# Altium integrated library vh_altium_library.intLib: 963 symbols (part 3 of 5) (continued)
## 74590A
designator U?
8-BIT BIN CNT WITH OUTPUT REGISTERS
footprint SO16W
pins: 1 QB (hiz), 2 QC (hiz), 3 QD (hiz), 4 QE (hiz), 5 QF (hiz), 6 QG (hiz), 7 QH (hiz), 8 GND (power) hidden to GND, 9 ~{RCO} (out), 10 ~{CCLR} (in), 11 CCK (in), 12 ~{CCKEN} (in), 13 RCK (in), 14 ~{G} (in), 15 QA (hiz), 16 VCC (power) hidden to VCC
1 alternate drawing of the same symbol

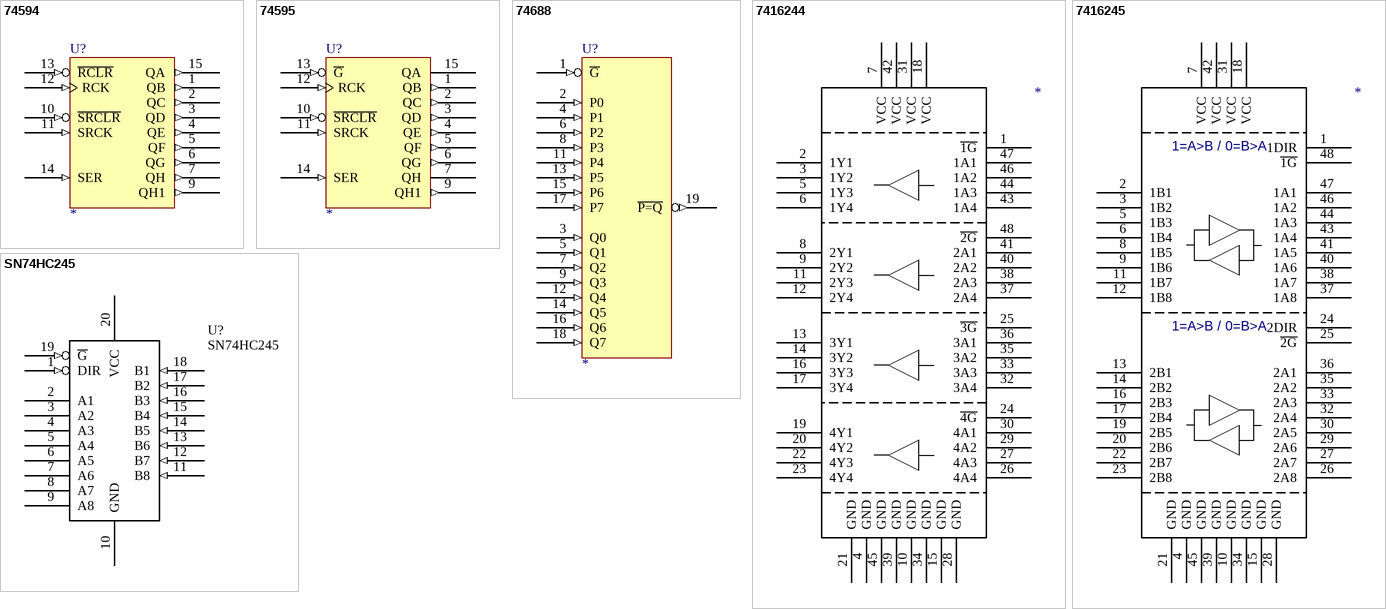
[diagram p34: symbols 74594 to SN74HC245]

## 74594
designator U?
8-BIT SFT REG WIRTH OUTPUT LCH
footprint SO16
pins: 1 QB (out), 2 QC (out), 3 QD (out), 4 QE (out), 5 QF (out), 6 QG (out), 7 QH (out), 8 GND (power) hidden to GND, 9 QH1 (out), 10 ~{SRCLR} (in), 11 SRCK (in), 12 RCK (in), 13 ~{RCLR} (in), 14 SER (in), 15 QA (out), 16 VCC (power) hidden to VCC
1 alternate drawing of the same symbol

## 74595
designator U?
8-BIT SFT REG WIRTH OUTPUT LCH
footprint SO16
pins: 1 QB (out), 2 QC (out), 3 QD (out), 4 QE (out), 5 QF (out), 6 QG (out), 7 QH (hiz), 8 GND (power) hidden to GND, 9 QH1 (out), 10 ~{SRCLR} (in), 11 SRCK (in), 12 RCK (in), 13 ~{G} (in), 14 SER (in), 15 QA (hiz), 16 VCC (power) hidden to VCC
1 alternate drawing of the same symbol

## 74688
designator U?
8-BIT IDENTITY COMPARATOR
footprint SO20W
pins: 1 ~{G} (in), 2 P0 (in), 3 Q0 (in), 4 P1 (in), 5 Q1 (in), 6 P2 (in), 7 Q2 (in), 8 P3 (in), 9 Q3 (in), 10 GND (power) hidden to GND, 11 P4 (in), 12 Q4 (in), 13 P5 (in), 14 Q5 (in), 15 P6 (in), 16 Q6 (in), 17 P7 (in), 18 Q7 (in), 19 ~{P=Q} (out), 20 VCC (power) hidden to VCC
1 alternate drawing of the same symbol

## 7416244
designator ?
pins: 1 ~{1G}, 2 1Y1, 3 1Y2, 4 GND, 5 1Y3, 6 1Y4, 7 VCC, 8 2Y1, 9 2Y2, 10 GND, 11 2Y3, 12 2Y4, 13 3Y1, 14 3Y2, 15 GND, 16 3Y3, 17 3Y4, 18 VCC, 19 4Y1, 20 4Y2, 21 GND, 22 4Y3, 23 4Y4, 24 ~{4G}, 25 ~{3G}, 26 4A4, 27 4A3, 28 GND, 29 4A2, 30 4A1, 31 VCC, 32 3A4, 33 3A3, 34 GND, 35 3A2, 36 3A1, 37 2A4, 38 2A3, 39 GND, 40 2A2, 41 2A1, 42 VCC, 43 1A4, 44 1A3, 45 GND, 46 1A2, 47 1A1, 48 ~{2G}

## 7416245
designator ?
pins: 1 1DIR, 2 1B1, 3 1B2, 4 GND, 5 1B3, 6 1B4, 7 VCC, 8 1B5, 9 1B6, 10 GND, 11 1B7, 12 1B8, 13 2B1, 14 2B2, 15 GND, 16 2B3, 17 2B4, 18 VCC, 19 2B5, 20 2B6, 21 GND, 22 2B7, 23 2B8, 24 2DIR, 25 ~{2G}, 26 2A8, 27 2A7, 28 GND, 29 2A6, 30 2A5, 31 VCC, 32 2A4, 33 2A3, 34 GND, 35 2A2, 36 2A1, 37 1A8, 38 1A7, 39 GND, 40 1A6, 41 1A5, 42 VCC, 43 1A4, 44 1A3, 45 GND, 46 1A2, 47 1A1, 48 ~{1G}
text: 1=A>B / 0=B>A

## SN74HC245
designator U?
QUAD BUS TRANSCEIVER 3SO
footprint SO20W
footprint SO20
pins: 1 DIR (in), 2 A1 (hiz), 3 A2 (hiz), 4 A3 (hiz), 5 A4 (hiz), 6 A5 (hiz), 7 A6 (hiz), 8 A7 (hiz), 9 A8 (hiz), 10 GND (power), 11 B8 (in), 12 B7 (in), 13 B6 (in), 14 B5 (in), 15 B4 (in), 16 B3 (in), 17 B2 (in), 18 B1 (in), 19 ~{G} (in), 20 VCC (power)
1 alternate drawing of the same symbol


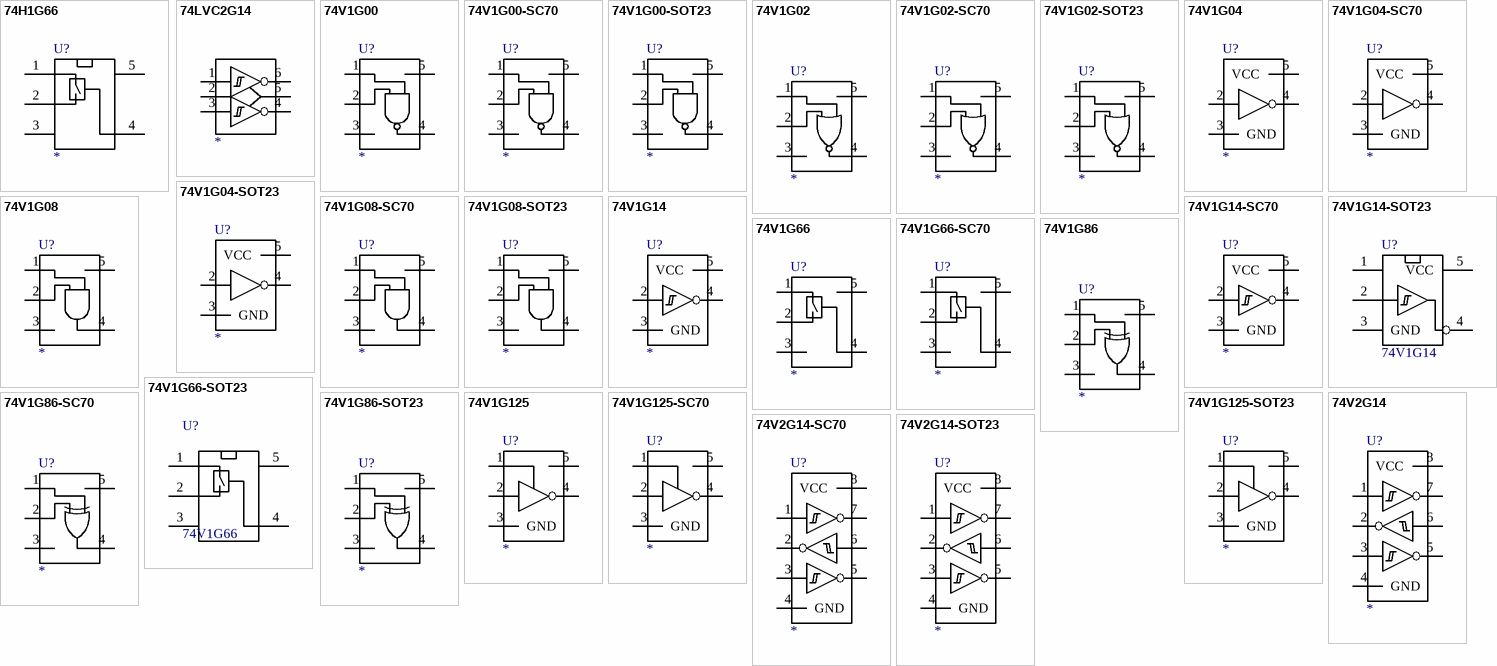
[diagram p35: symbols 74H1G66 to 74V2G14-SOT23]

## 74H1G66
designator U?
SINGLEGATE CMOS SWITCH SPST; Supplier 1: Digi-Key; Supplier Part Number 1: 497-1245-2-ND
footprint SOT23-5
pins: 1, 2, 3, 4, 5

## 74LVC2G14
designator ?
footprint SOT23-6
pins: 1, 2, 3, 4, 5, 6

## 74V1G00
designator U?
SINGLE GATE INVERTER
footprint SOT23-5
pins: 1, 2, 3, 4, 5

## 74V1G00-SC70
designator U?
SINGLE GATE INVERTER
footprint SOT23-5
pins: 1, 2, 3, 4, 5

## 74V1G00-SOT23
designator U?
SINGLE GATE INVERTER
footprint SOT23-5
pins: 1, 2, 3, 4, 5

## 74V1G02
designator U?
SINGLE GATE INVERTER
footprint SOT23-5
pins: 1, 2, 3, 4, 5

## 74V1G02-SC70
designator U?
SINGLE GATE INVERTER
footprint SOT23-5
pins: 1, 2, 3, 4, 5

## 74V1G02-SOT23
designator U?
SINGLE GATE INVERTER
footprint SOT23-5
pins: 1, 2, 3, 4, 5

## 74V1G04
designator U?
SINGLE GATE INVERTER
footprint SOT23-5
pins: 2, 3 GND, 4, 5 VCC

## 74V1G04-SC70
designator U?
SINGLE GATE INVERTER
footprint SOT23-5
pins: 2, 3 GND, 4, 5 VCC

## 74V1G04-SOT23
designator U?
SINGLE GATE INVERTER
footprint SOT23-5
pins: 2, 3 GND, 4, 5 VCC

## 74V1G08
designator U?
SINGLE GATE INVERTER
footprint SOT23-5
pins: 1, 2, 3, 4, 5

## 74V1G08-SC70
designator U?
SINGLE GATE INVERTER
footprint SOT23-5
pins: 1, 2, 3, 4, 5

## 74V1G08-SOT23
designator U?
SINGLE GATE INVERTER
footprint SOT23-5
pins: 1, 2, 3, 4, 5

## 74V1G14
designator U?
SINGLE GATE SCHMITTTRIGGER
footprint SOT23-5
pins: 2, 3 GND, 4, 5 VCC

## 74V1G14-SC70
designator U?
SINGLE GATE SCHMITTTRIGGER
footprint SOT23-5
pins: 2, 3 GND, 4, 5 VCC

## 74V1G14-SOT23
designator U?, comment 74V1G14
SINGLE GATE SCHMITTTRIGGER; Supplier 1: Digi-Key; Supplier Part Number 1: 497-1270-2-ND
footprint SOT23-5
pins: 1, 2, 3 GND, 4, 5 VCC

## 74V1G66
designator U?
SINGLE GATE INVERTER
footprint SOT23-5
pins: 1, 2, 3, 4, 5

## 74V1G66-SC70
designator U?
SINGLE GATE INVERTER
footprint SOT23-5
pins: 1, 2, 3, 4, 5

## 74V1G66-SOT23
designator U?, comment 74V1G66
SINGLE GATE INVERTER; Supplier 1: Digi-Key; Supplier Part Number 1: 497-1273-1-ND
footprint SOT23-5
pins: 1, 2, 3, 4, 5

## 74V1G86
designator U?
SINGLE GATE INVERTER
footprint SOT23-5
pins: 1, 2, 3, 4, 5

## 74V1G86-SC70
designator U?
SINGLE GATE INVERTER
footprint SOT23-5
pins: 1, 2, 3, 4, 5

## 74V1G86-SOT23
designator U?
SINGLE GATE INVERTER
footprint SOT23-5
pins: 1, 2, 3, 4, 5

## 74V1G125
designator U?
SINGLE GATE SCHMITTTRIGGER
footprint SOT23-5
pins: 1 ~{G}, 2, 3 GND, 4, 5 +

## 74V1G125-SC70
designator U?
SINGLE GATE SCHMITTTRIGGER
footprint SOT23-5
pins: 1 ~{G}, 2, 3 GND, 4, 5 +

## 74V1G125-SOT23
designator U?
SINGLE GATE SCHMITTTRIGGER
footprint SOT23-5
pins: 1 ~{G}, 2, 3 GND, 4, 5 +

## 74V2G14
designator U?
TRIPLE GATE SCHMITTTRIGGER
footprint SOT23-8
pins: 1, 2, 3, 4 GND, 5, 6, 7, 8 VCC

## 74V2G14-SC70
designator U?
TRIPLE GATE SCHMITTTRIGGER
footprint SOT23-8
pins: 1, 2, 3, 4 GND, 5, 6, 7, 8 VCC

## 74V2G14-SOT23
designator U?
TRIPLE GATE SCHMITTTRIGGER
footprint SOT23-8
pins: 1, 2, 3, 4 GND, 5, 6, 7, 8 VCC


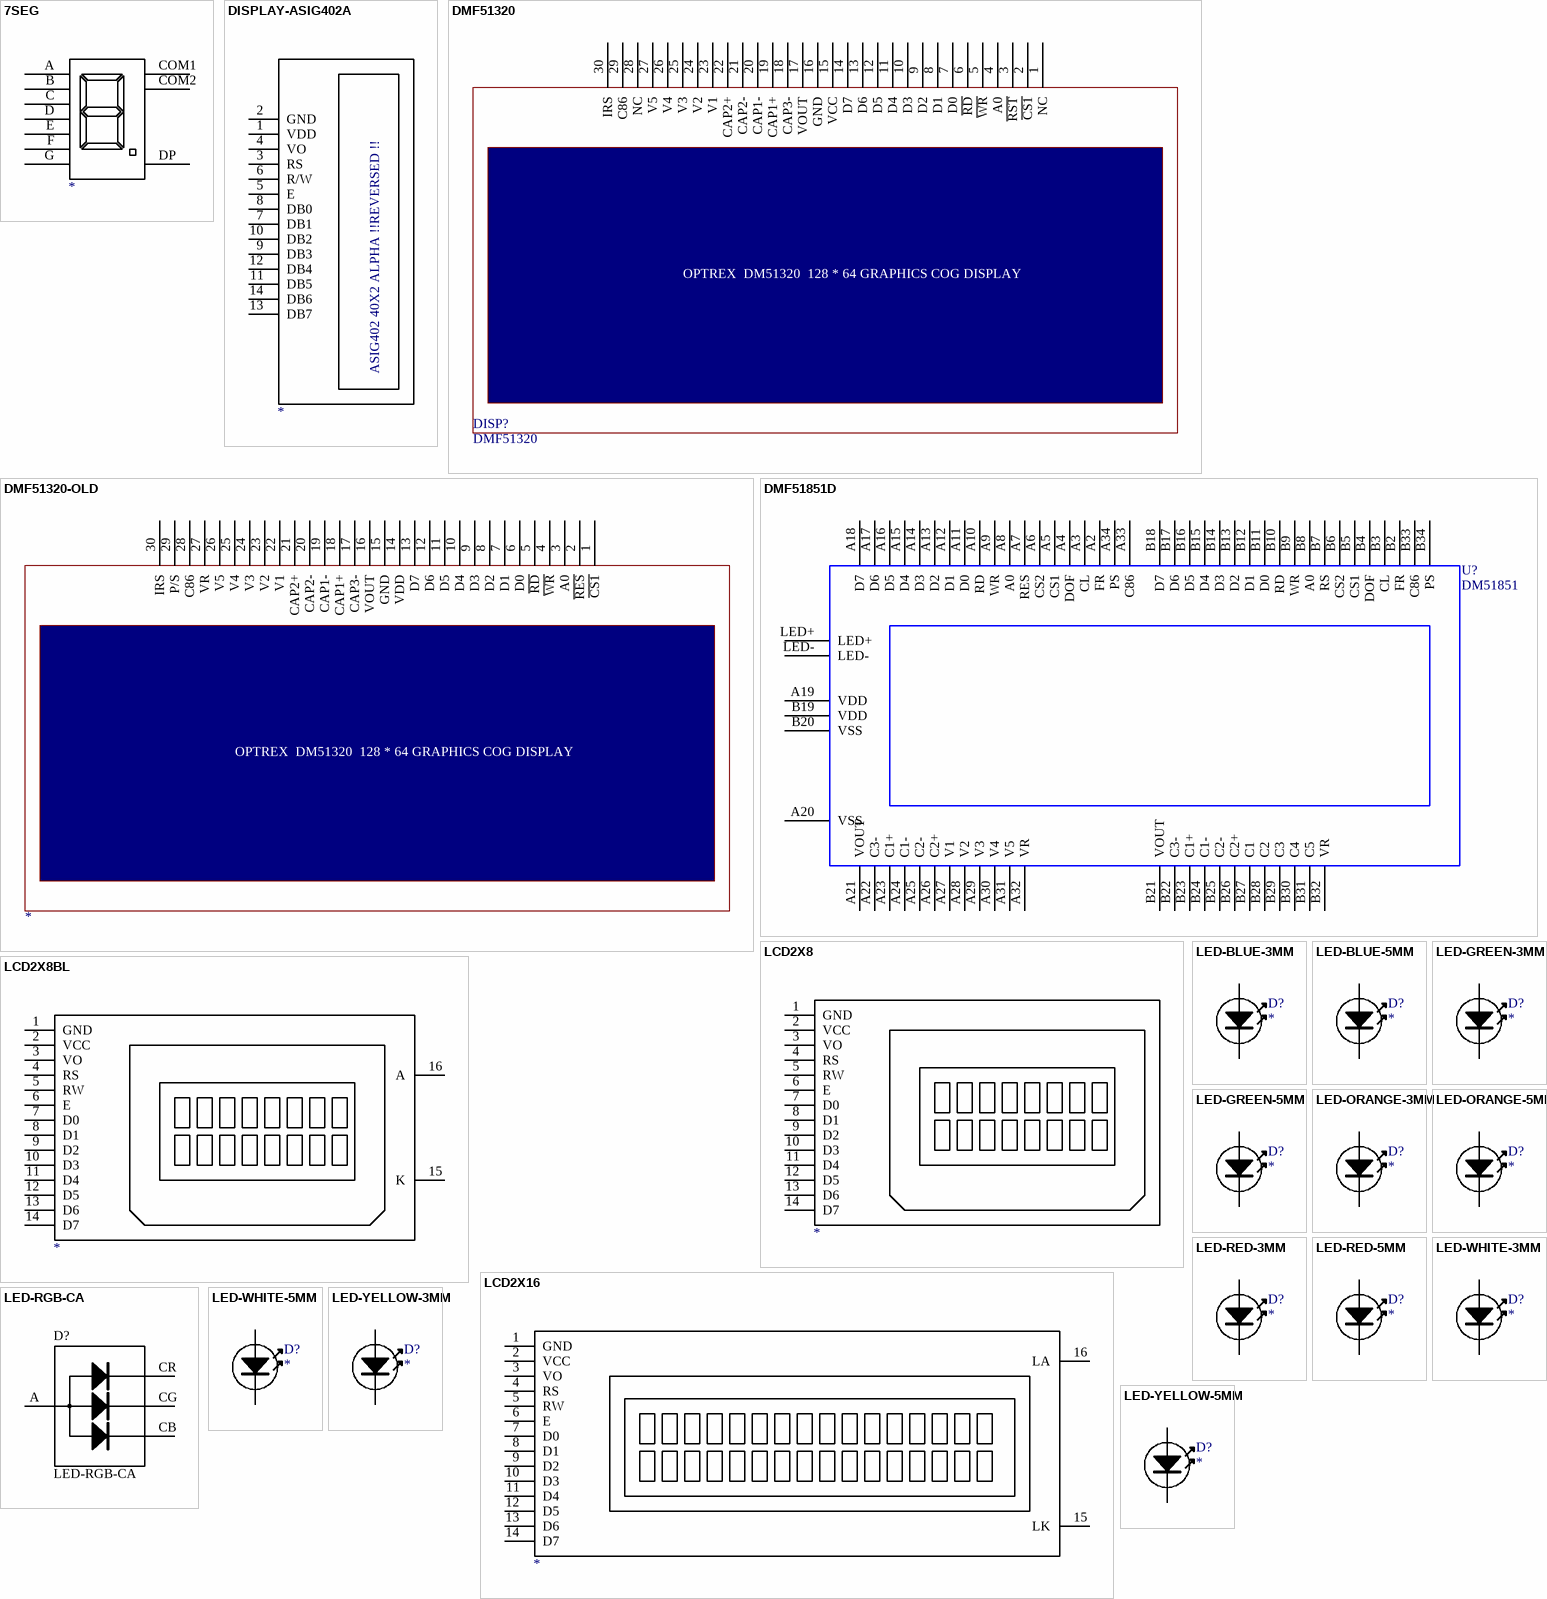
[diagram p36: symbols 7SEG to LED-YELLOW-5MM]

## 7SEG
designator ?
pins: A, B, C, COM1, COM2, D, DP, E, F, G

## DISPLAY-ASIG402A
designator ?
pins: 1 VDD, 2 GND, 3 RS, 4 VO, 5 E, 6 R/W, 7 DB1, 8 DB0, 9 DB3, 10 DB2, 11 DB5, 12 DB4, 13 DB7, 14 DB6
text: ASIG402 40X2 ALPHA !!REVERSED !!

## DMF51320
designator DISP?
pins: 1 NC, 2 ~{CS1}, 3 ~{RST}, 4 A0, 5 ~{WR}, 6 ~{RD}, 7 D0, 8 D1, 9 D2, 10 D3, 11 D4, 12 D5, 13 D6, 14 D7, 15 VCC, 16 GND, 17 VOUT, 18 CAP3-, 19 CAP1+, 20 CAP1-, 21 CAP2-, 22 CAP2+, 23 V1, 24 V2, 25 V3, 26 V4, 27 V5, 28 NC, 29 C86, 30 IRS
text: OPTREX  DM51320  128 * 64 GRAPHICS COG DISPLAY

## DMF51320-OLD
designator ?
pins: 1 ~{CS1}, 2 ~{RES}, 3 A0, 4 ~{WR}, 5 ~{RD}, 6 D0, 7 D1, 8 D2, 9 D3, 10 D4, 11 D5, 12 D6, 13 D7, 14 VDD, 15 GND, 16 VOUT, 17 CAP3-, 18 CAP1+, 19 CAP1-, 20 CAP2-, 21 CAP2+, 22 V1, 23 V2, 24 V3, 25 V4, 26 V5, 27 VR, 28 C86, 29 P/S, 30 IRS
text: OPTREX  DM51320  128 * 64 GRAPHICS COG DISPLAY

## DMF51851D
designator U?, comment DM51851
DM51851 DISPLAY 240X64
footprint F51851
pins: A2 FR, A3 CL, A4 DOF, A5 CS1, A6 CS2, A7 RES, A8 A0, A9 WR, A10 RD, A11 D0, A12 D1, A13 D2, A14 D3, A15 D4, A16 D5, A17 D6, A18 D7, A19 VDD, A20 VSS, A21 VOUT, A22 C3-, A23 C1+, A24 C1-, A25 C2-, A26 C2+, A27 V1, A28 V2, A29 V3, A30 V4, A31 V5, A32 VR, A33 C86, A34 PS, B2 FR, B3 CL, B4 DOF, B5 CS1, B6 CS2, B7 RS, B8 A0, B9 WR, B10 RD, B11 D0, B12 D1, B13 D2, B14 D3, B15 D4, B16 D5, B17 D6, B18 D7, B19 VDD, B20 VSS, B21 VOUT, B22 C3-, B23 C1+, B24 C1-, B25 C2-, B26 C2+, B27 C1, B28 C2, B29 C3, B30 C4, B31 C5, B32 VR, B33 C86, B34 PS, LED+, LED-

## LCD2X8
designator ?
footprint LCD2x8
pins: 1 GND, 2 VCC, 3 VO, 4 RS, 5 RW, 6 E, 7 D0, 8 D1, 9 D2, 10 D3, 11 D4, 12 D5, 13 D6, 14 D7

## LCD2X8BL
designator ?
footprint LCD2x8BL
pins: 1 GND, 2 VCC, 3 VO, 4 RS, 5 RW, 6 E, 7 D0, 8 D1, 9 D2, 10 D3, 11 D4, 12 D5, 13 D6, 14 D7, 15 K, 16 A

## LCD2X16
designator ?
pins: 1 GND, 2 VCC, 3 VO, 4 RS, 5 RW, 6 E, 7 D0, 8 D1, 9 D2, 10 D3, 11 D4, 12 D5, 13 D6, 14 D7, 15 LK, 16 LA

## LED-BLUE-3MM
designator D?
LED-BLUE-3MM
footprint LED-3MM-BLUE
pins: A, K

## LED-BLUE-5MM
designator D?
LED-BLUE-5MM
footprint LED-5MM-BLUE
pins: A, K

## LED-GREEN-3MM
designator D?
LED-GREEN-3MM
footprint LED-3MM-GREEN
pins: A, K

## LED-GREEN-5MM
designator D?
LED-GREEN-5MM
footprint LED-5MM-GREEN
pins: A, K

## LED-ORANGE-3MM
designator D?
LED-ORANGE-3MM
footprint LED-3MM-ORANGE
pins: A, K

## LED-ORANGE-5MM
designator D?
LED-ORANGE-5MM
footprint LED-5MM-ORANGE
pins: A, K

## LED-RED-3MM
designator D?
LED-RED-3MM
footprint LED-3MM-RED
pins: A, K

## LED-RED-5MM
designator D?
LED-RED-5MM
footprint LED-5MM-RED
pins: A, K

## LED-RGB-CA
designator D?
footprint LED-5MMRGBCA
pins: A, CB, CG, CR

## LED-WHITE-3MM
designator D?
LED-WHITE-3MM
footprint LED-3MM-WHITE
pins: A, K

## LED-WHITE-5MM
designator D?
LED-WHITE-5MM
footprint LED-5MM-WHITE
pins: A, K

## LED-YELLOW-3MM
designator D?
LED-YELLOW-3MM
footprint LED-3MM-YELLOW
pins: A, K

## LED-YELLOW-5MM
designator D?
LED-YELLOW-5MM
footprint LED-5MM-YELLOW
pins: A, K

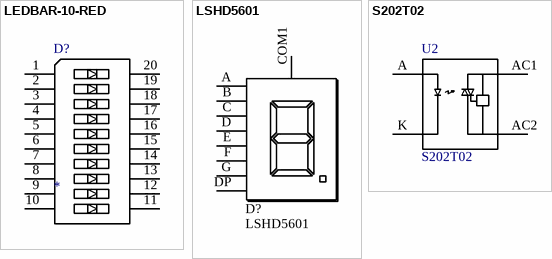
[diagram p37: symbols LEDBAR-10-RED to S202T02]

## LEDBAR-10-RED
designator D?
Supplier 1: Mouser; Supplier Part Number 1: 604-DC10GWA
footprint LEDBAR-10-RED
pins: 1, 2, 3, 4, 5, 6, 7, 8, 9, 10, 11, 12, 13, 14, 15, 16, 17, 18, 19, 20

## LSHD5601
designator D?
Supplier 1: Mouser; Supplier Part Number 1: 859-LSHD-5601
footprint LSHD5601
pins: A, B, C, COM1, D, DP, E, F, G

## S202T02
designator U2
Supplier 1: Digi-Key; Supplier 2: Digi-Key; Supplier Part Number 2: 425-2409-5-ND
footprint S202T02
pins: A, AC1, AC2, K


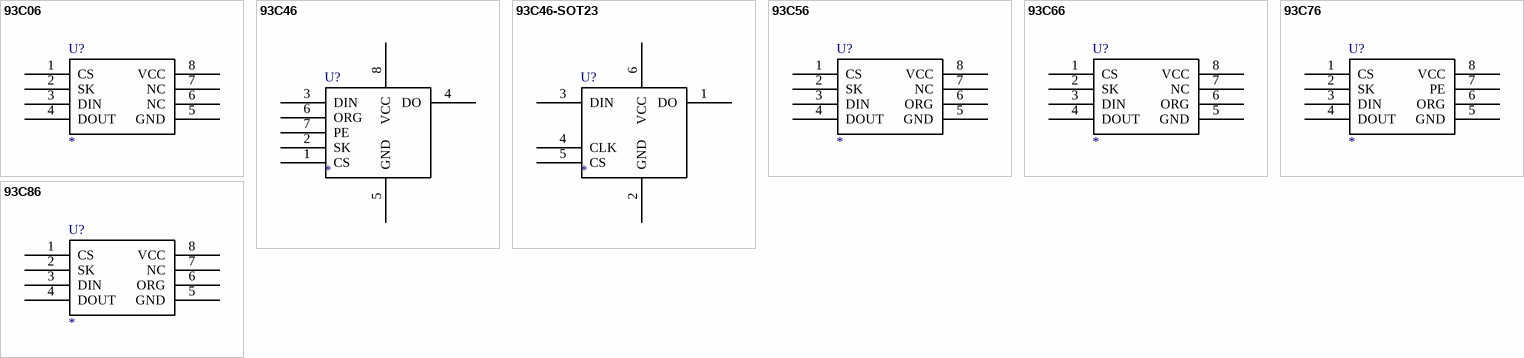
[diagram p38: symbols 93C06 to 93C86]

## 93C06
designator U?
MICROWIRE EEPROM
footprint SO8
pins: 1 CS, 2 SK, 3 DIN, 4 DOUT, 5 GND, 6 NC, 7 NC, 8 VCC

## 93C46
designator U?
MICROWIRE EEPROM
footprint SO8
pins: 1 CS, 2 SK, 3 DIN, 4 DO, 5 GND, 6 ORG, 7 PE, 8 VCC

## 93C46-SOT23
designator U?
MICROWIRE EEPROM
footprint SOT23-6
pins: 1 DO, 2 GND, 3 DIN, 4 CLK, 5 CS, 6 VCC

## 93C56
designator U?
MICROWIRE EEPROM
footprint SO8
pins: 1 CS, 2 SK, 3 DIN, 4 DOUT, 5 GND, 6 ORG, 7 NC, 8 VCC

## 93C66
designator U?
MICROWIRE EEPROM
footprint SO8
pins: 1 CS, 2 SK, 3 DIN, 4 DOUT, 5 GND, 6 ORG, 7 NC, 8 VCC

## 93C76
designator U?
MICROWIRE EEPROM
footprint SO8
pins: 1 CS, 2 SK, 3 DIN, 4 DOUT, 5 GND, 6 ORG, 7 PE, 8 VCC

## 93C86
designator U?
MICROWIRE EEPROM
footprint SO8
pins: 1 CS, 2 SK, 3 DIN, 4 DOUT, 5 GND, 6 ORG, 7 NC, 8 VCC


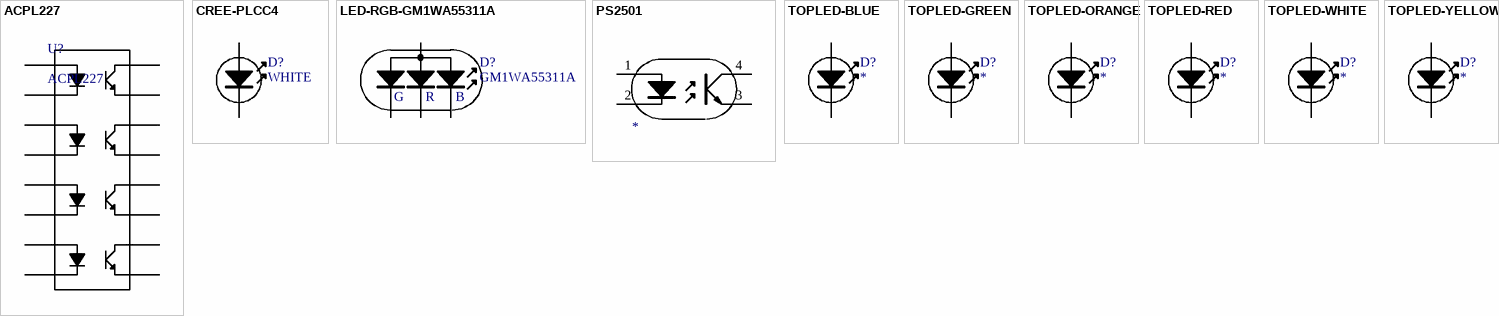
[diagram p39: symbols ACPL227 to TOPLED-YELLOW]

## ACPL227
designator U?
QUAD OPTOCOUPLER; Supplier 1: Mouser; Supplier Part Number 1: 630-ACPL-227-50BE
footprint SO16
pins: 1 A1, 2 K1, 3 A2, 4 K2, 5 A3, 6 K3, 7 A4, 8 K4, 9 E4, 10 C4, 11 E3, 12 C3, 13 E2, 14 C2, 15 E1, 16 C1

## CREE-PLCC4
designator D?, comment WHITE
CREE WHITE LED; Supplier 1: Digi-Key; Supplier Part Number 1: CLA1B-WKW-XD0F0E13TR-ND
footprint CREE-PLCC4
pins: A, K

## LED-RGB-GM1WA55311A
designator D?, comment GM1WA55311A
LED RGB SMD
pins: 1, 2, 3, 4 C
text: G; R; B

## PS2501
designator ?
pins: 1, 2, 3, 4

## TOPLED-BLUE
designator D?
TOPLED-BLUE; Manufacturer: Kingbright Corp; Manufacturer Part Number: AA3528APBC/A; Description: LED 3.5X2.8MM 470NM BLUE CLR SMD; Supplier 1: Digi-Key; Supplier Part Number 1: 754-1011-2-ND
footprint TOPLED-BLUE
pins: A, K

## TOPLED-GREEN
designator D?
TOPLED-GREEN
footprint TOPLED-GREEN
pins: A, K

## TOPLED-ORANGE
designator D?
TOPLED-ORANGE; Reel: D13; Supplier 1: Digi-Key; Supplier Part Number 1: 475-2562-2-ND
footprint TOPLED-ORANGE
pins: A, K

## TOPLED-RED
designator D?
TOPLED-RED; Manufacturer: OSRAM Opto Semiconductors Inc; Manufacturer Part Number: LS T676-Q1R2-1-Z; Description: LED SUP RED 645NM CLR 2-PLCC SMD; Reel: D13; Supplier 1: Digi-Key; Supplier Part Number 1: 475-1133-2-ND
footprint TOPLED-RED
pins: A, K

## TOPLED-WHITE
designator D?
TOPLED-WHITE
footprint TOPLED-WHITE
pins: A, K

## TOPLED-YELLOW
designator D?
TOPLED-YELLOW; Manufacturer Part Number: LY T676-S1T1-26-Z; Manufacturer: OSRAM Opto Semiconductors Inc; Description: LED TOPLED 587NM YELLOW 2-PLCC; Supplier 1: Digi-Key; Supplier Part Number 1: 475-2665-2-ND
footprint TOPLED-YELLOW
pins: A, K


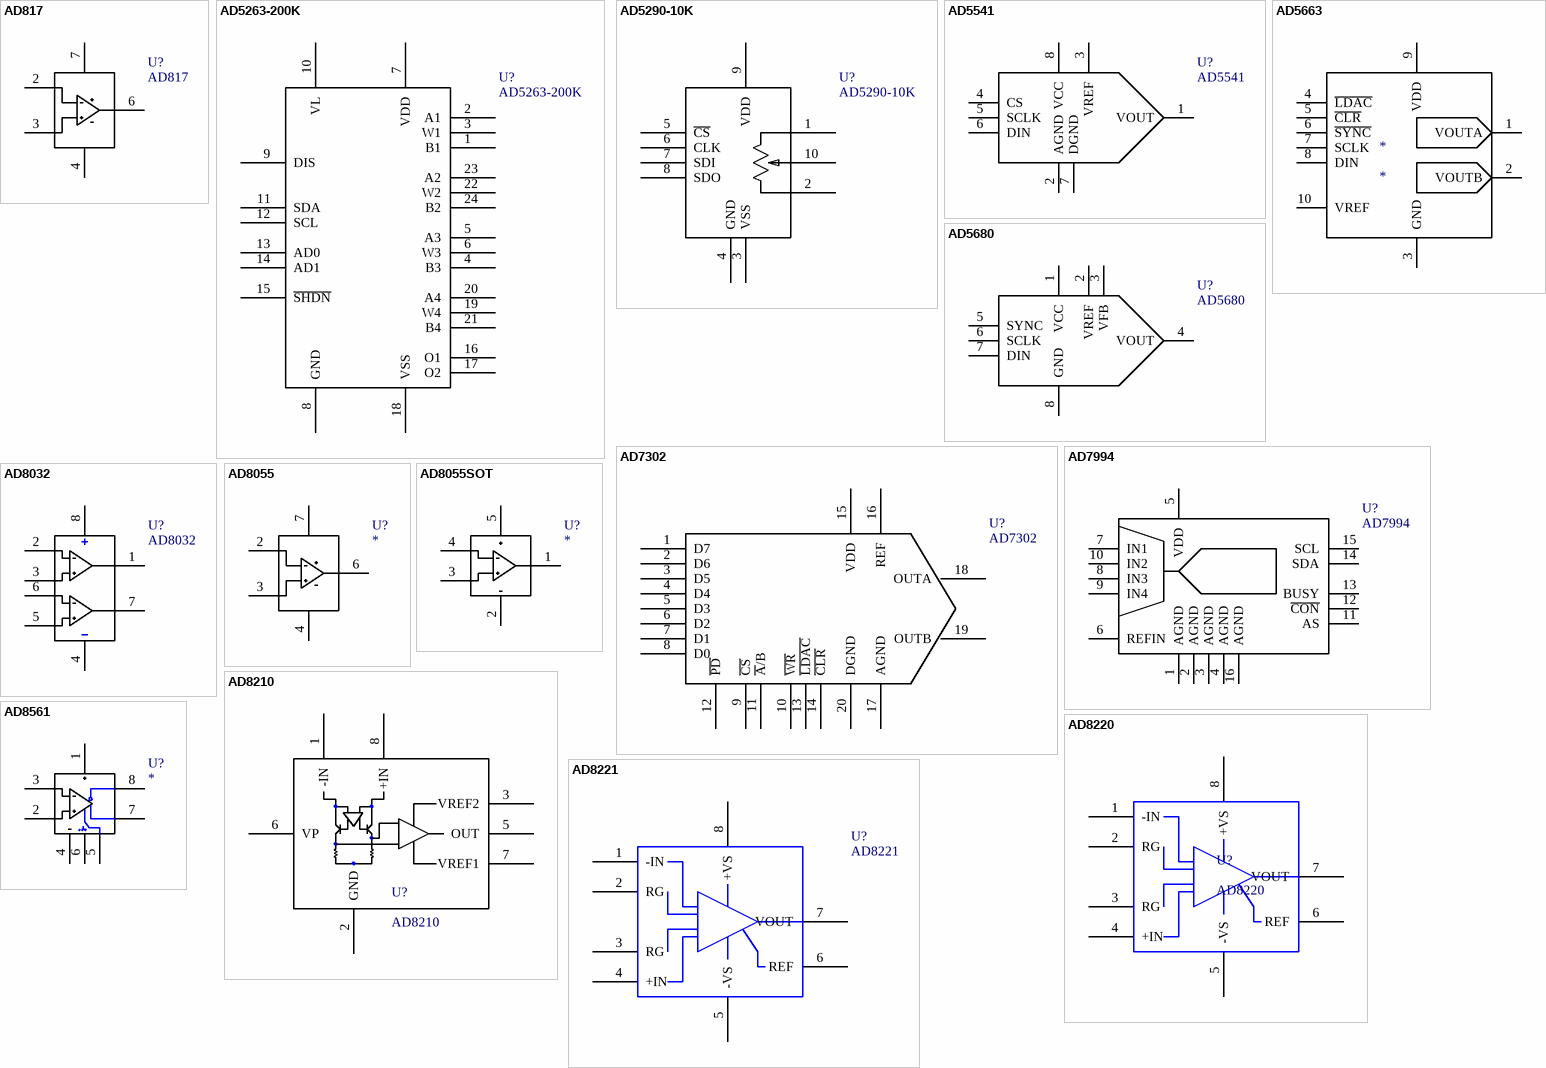
[diagram p40: symbols AD817 to AD8561]

## AD817
designator U?
OPAMP; Manufacturer Part Number: AD817ARZ; Manufacturer: Analog Devices Inc; Description: IC OPAMP LP HS 8-SOIC; Slew Rate: 350 V/µs; Current - Supply: 7mA; Number of Circuits: 1; Voltage - Supply, Single/Dual (±): 5 V ~ 36 V, ±2.5 V ~ 18 V; -3db Bandwidth: 50MHz; Current - Output / Channel: 50mA; Supplier 1: Digi-Key; Supplier Part Number 1: AD817ARZ-ND; Supplier Part Number: AD817ARZ-ND; Applications: General Purpose; Packaging: Tube; Package / Case: 8-SOIC (3.9mm Width); Supplier Device Package: *; Output Type: -; RoHS: RoHS Compliant; Category: Integrated Circuits (ICs); Mounting Type: Surface Mount; Supplier: Digi-Key
footprint SO8
pins: 2, 3, 4, 6, 7

## AD5263-200K
designator U?
QUAD DIGITAL POTMETER; Manufacturer Part Number: AD5263BRU200; Manufacturer: Analog Devices Inc; Voltage - Supply: 2.7 V ~ 16.5 V, ±4.5 V ~ 7.5 V; Temperature Coefficient: 30 ppm/°C Typical; Taps: 256; Resistance In Ohms: 200K; Number of Circuits: 4; Memory Type: Volatile; Description: IC POT QUAD 200K 256POS 24-TSSOP; Interface: I²C, SPI; Supplier 1: Digi-Key; Supplier Part Number 1: AD5263BRU200-ND; Package / Case: 24-TSSOP; Category: Integrated Circuits (ICs); Operating Temperature: -40°C ~ 125°C; Supplier Part Number: AD5263BRU200-ND; Packaging: Tube; RoHS: RoHS non-compliant; Supplier: Digi-Key
footprint TSSOP24
pins: 1 B1, 2 A1, 3 W1, 4 B3, 5 A3, 6 W3, 7 VDD, 8 GND, 9 DIS, 10 VL, 11 SDA, 12 SCL, 13 AD0, 14 AD1, 15 ~{SHDN}, 16 O1, 17 O2, 18 VSS, 19 W4, 20 A4, 21 B4, 22 W2, 23 A2, 24 B2

## AD5290-10K
designator U?
AD5290 DIGITAL POTMETER; Manufacturer: Analog Devices Inc; Manufacturer Part Number: AD5290YRMZ10; Voltage - Supply: 4.5 V ~ 30 V, ±4.5 V ~ 15 V; Description: IC DGTL POT 10K 256POS 10MSOP; Number of Circuits: 1; Resistance In Ohms: 10K; Memory Type: Volatile; Temperature Coefficient: 35 ppm/°C Typical; Interface: SPI, 3-Wire Serial; Taps: 256; Supplier 1: Digi-Key; Supplier Part Number 1: AD5290YRMZ10-ND; Category: Integrated Circuits (ICs); Supplier Part Number: AD5290YRMZ10-ND; RoHS: RoHS Compliant; Package / Case: 10-MSOP, Micro10™, 10-uMAX, 10-uSOP; Supplier: Digi-Key; Operating Temperature: -40°C ~ 125°C; Packaging: Tube
footprint Msop10
pins: 1 A, 2 B, 3 VSS, 4 GND, 5 ~{CS}, 6 CLK, 7 SDI, 8 SDO, 9 VDD, 10 W

## AD5541
designator U?
16 BIT D/A CONVERTOR; Manufacturer Part Number: AD5541JRZ; Manufacturer: Analog Devices Inc; Settling Time: 1µs; Voltage Supply Source: Single Supply; Description: IC DAC 16BIT SERIAL IN 8-SOIC; Data Interface: Serial; Number of Bits: 16; Power Dissipation (Max): 6.05mW; Number of Converters: 1; Number of Outputs and Type: 1 Voltage, Unipolar; 1 Voltage, Bipolar; Supplier 1: Digi-Key; Supplier Part Number 1: AD5541JRZ-ND; RoHS: RoHS Compliant; Supplier Part Number: AD5541JRZ-ND; Supplier: Digi-Key; Operating Temperature: 0°C ~ 70°C; Category: Integrated Circuits (ICs); Packaging: Tube; Package / Case: 8-SOIC (3.9mm Width)
footprint so8
pins: 1 VOUT, 2 AGND, 3 VREF, 4 CS, 5 SCLK, 6 DIN, 7 DGND, 8 VCC

## AD5663
designator *
Supplier 1: Digi-Key; Supplier Part Number 1: AD5663ARMZ-ND
pins: 1 VOUTA, 2 VOUTB, 3 GND, 4 ~{LDAC}, 5 ~{CLR}, 6 ~{SYNC}, 7 SCLK, 8 DIN, 9 VDD, 10 VREF

## AD5680
designator U?
18 BIT D/A CONVERTOR; Manufacturer: Analog Devices Inc; Manufacturer Part Number: AD5680BRJZ-2REEL7; Power Dissipation (Max): 2.25mW; Settling Time: 80µs; Description: IC DAC 18BIT 5V SOT23-8; Number of Converters: 1; Number of Outputs and Type: 1 Voltage, Unipolar; Number of Bits: 18; Data Interface: Serial; Voltage Supply Source: Single Supply; Supplier 1: Digi-Key; Supplier Part Number 1: AD5680BRJZ-2REEL7DKR-ND; Supplier: Digi-Key; Supplier Part Number: AD5680BRJZ-2REEL7DKR-ND; Operating Temperature: -40°C ~ 105°C; Package / Case: SOT-23-8; RoHS: RoHS Compliant; Category: Integrated Circuits (ICs); Packaging: Digi-Reel®
footprint SOT23-8
pins: 1 VCC, 2 VREF, 3 VFB, 4 VOUT, 5 SYNC, 6 SCLK, 7 DIN, 8 GND

## AD7302
designator U?
DUAL 8 BIT D/A CONVERTOR; Manufacturer Part Number: AD7302BRZ; Manufacturer: Analog Devices Inc; Number of Bits: 8; Data Interface: Parallel; Number of Outputs and Type: 2 Voltage, Unipolar; 2 Voltage, Bipolar; Description: IC DAC 8BIT DUAL R-R 20-SOIC; Power Dissipation (Max): 24.8mW; Voltage Supply Source: Single Supply; Settling Time: 1.2µs; Number of Converters: 2; Supplier 1: Digi-Key; Supplier Part Number 1: AD7302BRZ-ND; Category: Integrated Circuits (ICs); Operating Temperature: -40°C ~ 105°C; Supplier: Digi-Key; Supplier Part Number: AD7302BRZ-ND; Packaging: Tube; Package / Case: 20-SOIC (7.5mm Width); RoHS: RoHS Compliant
footprint SO20
pins: 1 D7, 2 D6, 3 D5, 4 D4, 5 D3, 6 D2, 7 D1, 8 D0, 9 ~{CS}, 10 ~{WR}, 11 ~{A}/B, 12 ~{PD}, 13 ~{LDAC}, 14 ~{CLR}, 15 VDD, 16 REF, 17 AGND, 18 OUTA, 19 OUTB, 20 DGND

## AD7994
designator U?
4 CHANNEL 12 BIT A/D CONVERTOR; Manufacturer: Analog Devices Inc; Manufacturer Part Number: AD7994BRUZ-0; Data Interface: I²C; Number of Bits: 12; Number of Converters: 1; Number of Inputs and Type: 4 Single-Ended, Unipolar; Voltage Supply Source: Single Supply; Description: IC ADC 12BIT 4CHAN I2C 16TSSOP; Power Dissipation (Max): 2.2mW; Sampling Rate (Per Second): 188k; Supplier 1: Digi-Key; Supplier Part Number 1: AD7994BRUZ-0-ND; Operating Temperature: -40°C ~ 125°C; Package / Case: 16-TSSOP; RoHS: RoHS Compliant; Packaging: Tube; Supplier: Digi-Key; Supplier Part Number: AD7994BRUZ-0-ND; Category: Integrated Circuits (ICs)
footprint TSSOP16
pins: 1 AGND, 2 AGND, 3 AGND, 4 AGND, 5 VDD, 6 REFIN, 7 IN1, 8 IN3, 9 IN4, 10 IN2, 11 AS, 12 ~{CON}, 13 BUSY, 14 SDA, 15 SCL, 16 AGND

## AD8032
designator U?
DUAL OPAMP; Manufacturer Part Number: AD8032ARZ; Manufacturer: Analog Devices Inc; Text Field1: ST; Text Field2: LM2903DT; Text Field3: Avnet; Text Field5: SO8; Text Field6: 0.078; Voltage - Input Offset: 1000µV; Slew Rate: 35 V/µs; Number of Circuits: 2; Voltage - Supply, Single/Dual (±): 2.7 V ~ 12 V, ±1.35 V ~ 6 V; Current - Input Bias: 450nA; Description: IC OPAMP VF R-R DUAL LP 8SOIC; Current - Output / Channel: 15mA; Output Type: Rail-to-Rail; Amplifier Type: Voltage Feedback; Current - Supply: 900µA; Text Field4: LM2903DT; NI?: *; O?: *; Section:: *; Supplier 1: Digi-Key; Supplier Part Number 1: AD8032ARZ-ND; Gain Bandwidth Product: -; Supplier: Digi-Key; Package / Case: 8-SOIC (3.9mm Width); Operating Temperature: -40°C ~ 85°C; Supplier Part Number: AD8032ARZ-ND; Packaging: Tube; RoHS: RoHS Compliant; Category: Integrated Circuits (ICs)
footprint SO8
pins: 1, 2, 3, 4, 5, 6, 7, 8

## AD8055
designator U?
OPAMP; Manufacturer Part Number: AD8055AR; Manufacturer: Analog Devices Inc; Text Field1: ST; Text Field2: LM2903DT; Text Field3: Avnet; Text Field5: SO8; Text Field6: 0.078; Amplifier Type: Voltage Feedback; Voltage - Input Offset: 3000µV; Current - Output / Channel: 60mA; Description: IC OPAMP VF LDIST LN LP 8SOIC; Current - Supply: 5.4mA; Voltage - Supply, Single/Dual (±): 8 V ~ 12 V, ±4 V ~ 6 V; Number of Circuits: 1; Slew Rate: 1400 V/µs; Current - Input Bias: 400nA; Text Field4: LM2903DT; NI?: *; O?: *; Section:: *; Supplier 1: Digi-Key; Supplier Part Number 1: AD8055AR-ND; Category: Integrated Circuits (ICs); RoHS: RoHS non-compliant; Gain Bandwidth Product: -; Supplier Part Number: AD8055AR-ND; Output Type: -; Operating Temperature: -40°C ~ 125°C; Supplier: Digi-Key; Package / Case: 8-SOIC (3.9mm Width); Packaging: Tube
footprint SO8
pins: 2, 3, 4, 6, 7